# Altium footprint library Connectors Molex.PcbLib: 105 footprints (part 5 of 7)
Each footprint in its own frame and in the unit in brackets; x right, y up, seen from the top. Pads: shape width x height; smd on the part's side, far side on the other; paste and mask are expansions set on the pad; w line width, h text height; cw(c..) or ccw(c..) is an arc to the next point about the centre after c.
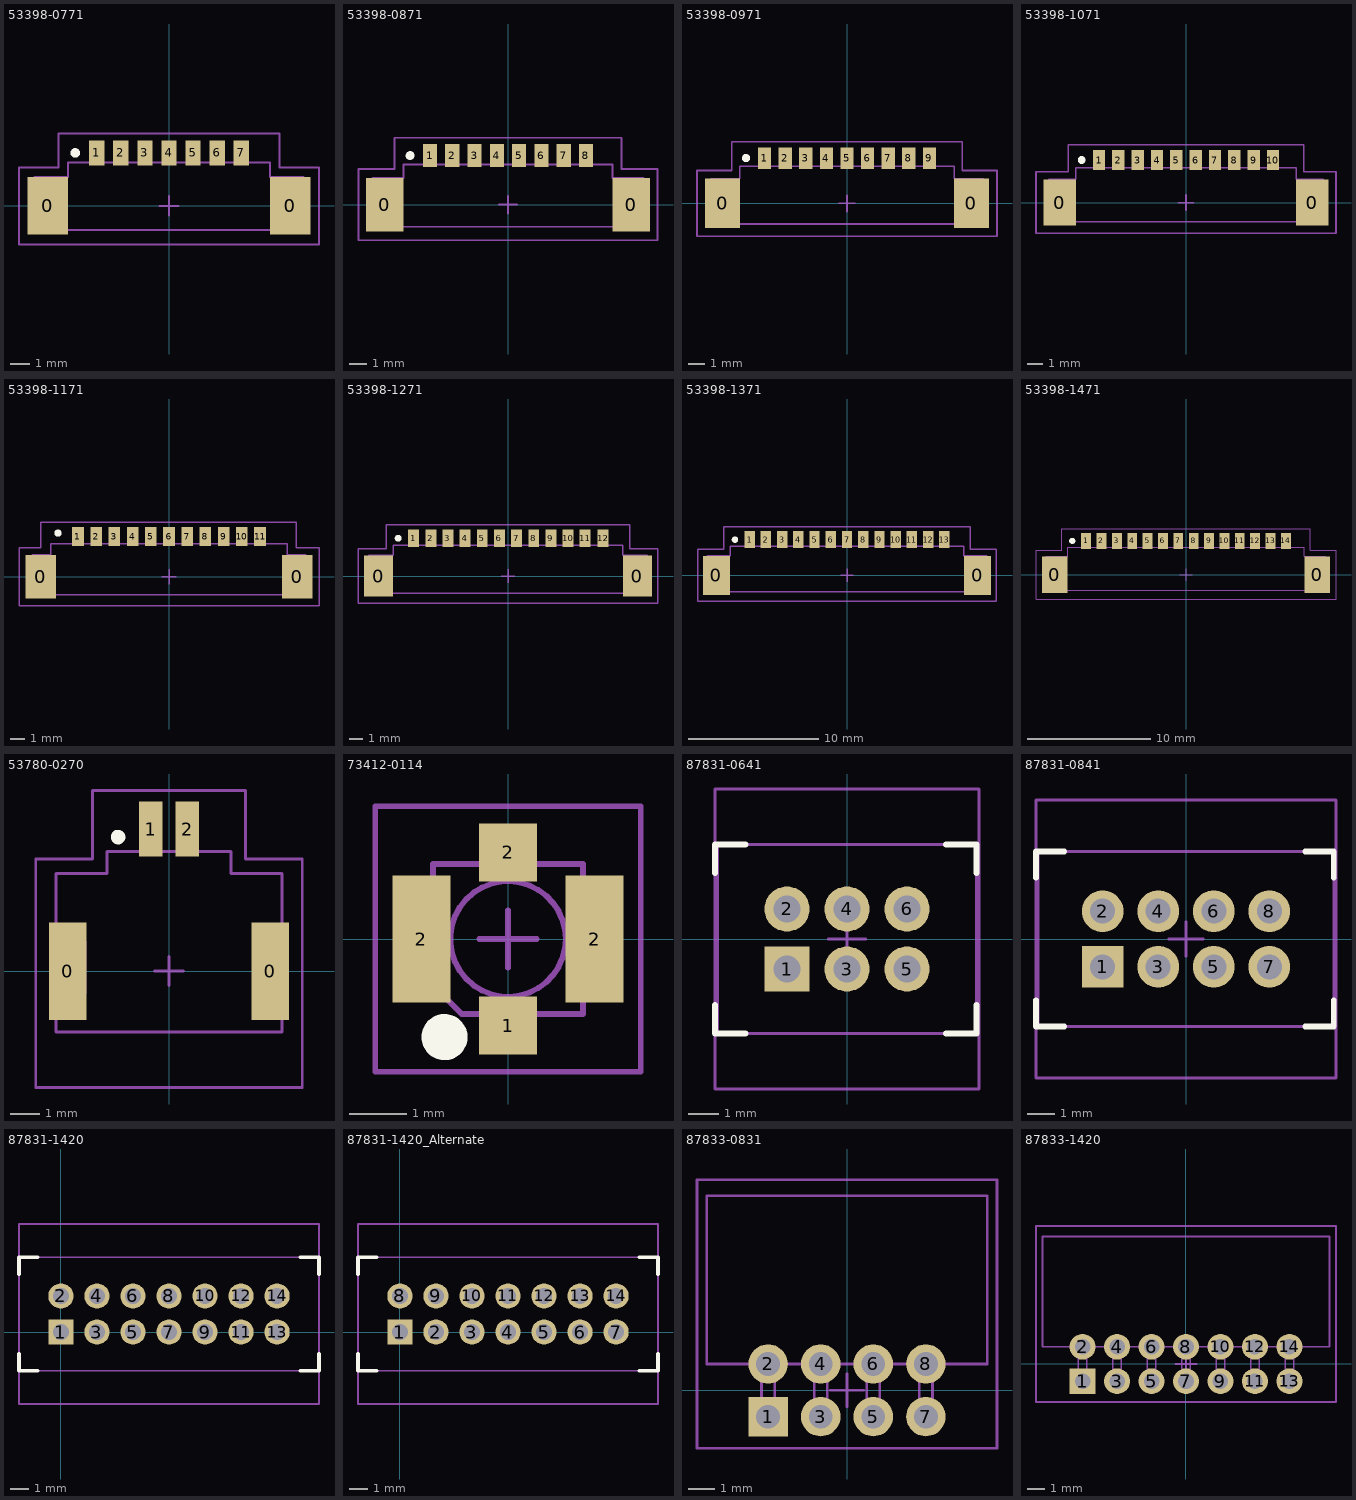
[diagram p4: the footprints below, top view; thin cyan lines are the x and y axes]

## 53398-0771 [mm] "PicoBlade™ 53398-0771"
height 4.7
pads (9):
  rect 2.1x3 smd: 0(-6.3,0) 0(6.3,0)
  rect 0.8x1.3 smd: 1(-3.75,2.75) 2(-2.5,2.75) 3(-1.25,2.75) 4(0,2.75) 5(1.25,2.75) 6(2.5,2.75) 7(3.75,2.75)
Top Overlay:
  circle w0.25: c-4.875,2.75 r0.125
Mechanical 1:
  lines w0.1: -7,-1.25 -7,1.5 -5.25,1.5 -5.25,2.25 5.25,2.25 5.25,1.5 7,1.5 7,-1.25 -7,-1.25
Mechanical 13:
  lines w0.1: -6.5,0.5 -6,1 -6,-0.75 ; -4,2.25 -4,3.25 -3.5,3.25 -3.5,2.25 ; -2.75,2.25 -2.75,3.25 -2.25,3.25 -2.25,2.25 ; -1.5,2.25 -1.5,3.25 -1,3.25 -1,2.25 ; -0.25,2.25 -0.25,3.25 0.25,3.25 0.25,2.25 ; 1,2.25 1,3.25 1.5,3.25 1.5,2.25 ; 2.25,2.25 2.25,3.25 2.75,3.25 2.75,2.25 ; 3.5,2.25 3.5,3.25 4,3.25 4,2.25 ; -7,-1.25 -7,1.5 -5.25,1.5 -5.25,2.25 5.25,2.25 5.25,1.5 7,1.5 7,-1.25 -7,-1.25
  text ".Designator" at -1.95,-0.375 h1.5
Mechanical 15:
  lines w0.1: -0.5,0 0.5,0 ; 0,-0.5 0,0.5 ; -7.8,-2 -7.8,2 -5.75,2 -5.75,3.75 -3,3.75 5.75,3.75 5.75,2 7.8,2 7.8,-2 -7.8,-2
3D body "533980771.stp": height 4.7, standoff 0, extent -6.95,-1.35 6.95,2.85

## 53398-0871 [mm] "PicoBlade™ 53398-0871"
height 4.7
pads (10):
  rect 2.1x3 smd: 0(-6.925,0) 0(6.925,0)
  rect 0.8x1.3 smd: 1(-4.375,2.75) 2(-3.125,2.75) 3(-1.875,2.75) 4(-0.625,2.75) 5(0.625,2.75) 6(1.875,2.75) 7(3.125,2.75) 8(4.375,2.75)
Top Overlay:
  circle w0.25: c-5.5,2.75 r0.125
Mechanical 1:
  lines w0.1: -7.625,-1.25 7.625,-1.25 7.625,1.5 5.875,1.5 5.875,2.25 -5.875,2.25 -5.875,1.5 -7.625,1.5 -7.625,-1.25
Mechanical 13:
  lines w0.1: -7.125,0.5 -6.625,1 -6.625,-0.75 ; -4.625,2.25 -4.625,3.25 -4.125,3.25 -4.125,2.25 ; -3.375,2.25 -3.375,3.25 -2.875,3.25 -2.875,2.25 ; -2.125,2.25 -2.125,3.25 -1.625,3.25 -1.625,2.25 ; -0.875,2.25 -0.875,3.25 -0.375,3.25 -0.375,2.25 ; 0.375,2.25 0.375,3.25 0.875,3.25 0.875,2.25 ; 1.625,2.25 1.625,3.25 2.125,3.25 2.125,2.25 ; 2.875,2.25 2.875,3.25 3.375,3.25 3.375,2.25 ; 4.125,2.25 4.125,3.25 4.625,3.25 4.625,2.25 ; -7.625,-1.25 7.625,-1.25 7.625,1.5 5.875,1.5 5.875,2.25 -5.875,2.25 -5.875,1.5 -7.625,1.5 -7.625,-1.25
  text ".Designator" at -1.925,-0.275 h1.5
Mechanical 15:
  lines w0.1: -0.5,0 0.5,0 ; 0,-0.5 0,0.5 ; -8.4,-2 8.4,-2 8.4,2 6.375,2 6.375,3.75 -3.625,3.75 -6.375,3.75 -6.375,2 -8.4,2 -8.4,-2
3D body "533980871.stp": height 4.7, standoff 0, extent -7.575,-1.35 7.575,2.85

## 53398-0971 [mm] "PicoBlade™ 53398-0971"
height 4.7
pads (11):
  rect 2.1x3 smd: 0(-7.55,0) 0(7.55,0)
  rect 0.8x1.3 smd: 1(-5,2.75) 2(-3.75,2.75) 3(-2.5,2.75) 4(-1.25,2.75) 5(0,2.75) 6(1.25,2.75) 7(2.5,2.75) 8(3.75,2.75) 9(5,2.75)
Top Overlay:
  circle w0.25: c-6.125,2.75 r0.125
Mechanical 1:
  lines w0.1: -8.25,-1.25 8.25,-1.25 8.25,1.5 6.5,1.5 6.5,2.25 -6.5,2.25 -6.5,1.5 -8.25,1.5 -8.25,-1.25
Mechanical 13:
  lines w0.1: -7.75,0.5 -7.25,1 -7.25,-0.75 ; -5.25,2.25 -5.25,3.25 -4.75,3.25 -4.75,2.25 ; -4,2.25 -4,3.25 -3.5,3.25 -3.5,2.25 ; -2.75,2.25 -2.75,3.25 -2.25,3.25 -2.25,2.25 ; -1.5,2.25 -1.5,3.25 -1,3.25 -1,2.25 ; -0.25,2.25 -0.25,3.25 0.25,3.25 0.25,2.25 ; 1,2.25 1,3.25 1.5,3.25 1.5,2.25 ; 2.25,2.25 2.25,3.25 2.75,3.25 2.75,2.25 ; 3.5,2.25 3.5,3.25 4,3.25 4,2.25 ; 4.75,2.25 4.75,3.25 5.25,3.25 5.25,2.25 ; -8.25,-1.25 8.25,-1.25 8.25,1.5 6.5,1.5 6.5,2.25 -6.5,2.25 -6.5,1.5 -8.25,1.5 -8.25,-1.25
  text ".Designator" at -2,-0.325 h1.5
Mechanical 15:
  lines w0.1: -0.5,0 0.5,0 ; 0,-0.5 0,0.5 ; -9.1,-2 9.1,-2 9.1,2 7,2 7,3.75 -3,3.75 -7,3.75 -7,2 -9.1,2 -9.1,-2
3D body "533980971.stp": height 4.7, standoff 0, extent -8.2,-1.35 8.2,2.85

## 53398-1071 [mm] "PicoBlade™ 53398-1071"
height 4.7
pads (12):
  rect 2.1x3 smd: 0(-8.175,0) 0(8.175,0)
  rect 0.8x1.3 smd: 1(-5.625,2.75) 2(-4.375,2.75) 3(-3.125,2.75) 4(-1.875,2.75) 5(-0.625,2.75) 6(0.625,2.75) 7(1.875,2.75) 8(3.125,2.75) 9(4.375,2.75) 10(5.625,2.75)
Top Overlay:
  circle w0.25: c-6.75,2.75 r0.125
Mechanical 1:
  lines w0.1: -8.875,-1.25 -8.875,1.5 -7.125,1.5 -7.125,2.25 7.125,2.25 7.125,1.5 8.875,1.5 8.875,-1.25 -8.875,-1.25
Mechanical 13:
  lines w0.1: -8.375,0.5 -7.875,1 -7.875,-0.75 ; -5.875,2.25 -5.875,3.25 -5.375,3.25 -5.375,2.25 ; -4.625,2.25 -4.625,3.25 -4.125,3.25 -4.125,2.25 ; -3.375,2.25 -3.375,3.25 -2.875,3.25 -2.875,2.25 ; -2.125,2.25 -2.125,3.25 -1.625,3.25 -1.625,2.25 ; -0.875,2.25 -0.875,3.25 -0.375,3.25 -0.375,2.25 ; 0.375,2.25 0.375,3.25 0.875,3.25 0.875,2.25 ; 1.625,2.25 1.625,3.25 2.125,3.25 2.125,2.25 ; 2.875,2.25 2.875,3.25 3.375,3.25 3.375,2.25 ; 4.125,2.25 4.125,3.25 4.625,3.25 4.625,2.25 ; 5.375,2.25 5.375,3.25 5.875,3.25 5.875,2.25 ; -8.875,-1.25 -8.875,1.5 -7.125,1.5 -7.125,2.25 7.125,2.25 7.125,1.5 8.875,1.5 8.875,-1.25 -8.875,-1.25
  text ".Designator" at -1.925,-0.35 h1.5
Mechanical 15:
  lines w0.1: -0.5,0 0.5,0 ; 0,-0.5 0,0.5 ; -9.7,-2 -9.7,2 -7.625,2 -7.625,3.75 -3.625,3.75 7.625,3.75 7.625,2 9.7,2 9.7,-2 -9.7,-2
3D body "533981071.stp": height 4.7, standoff 0, extent -8.825,-1.35 8.825,2.85

## 53398-1171 [mm] "PicoBlade™ 53398-1171"
height 4.7
pads (13):
  rect 2.1x3 smd: 0(-8.8,0) 0(8.8,0)
  rect 0.8x1.3 smd: 1(-6.25,2.75) 2(-5,2.75) 3(-3.75,2.75) 4(-2.5,2.75) 5(-1.25,2.75) 6(0,2.75) 7(1.25,2.75) 8(2.5,2.75) 9(3.75,2.75) 10(5,2.75) 11(6.25,2.75)
Top Overlay:
  circle w0.25: c-7.625,3 r0.125
Mechanical 1:
  lines w0.1: -9.375,-1.25 -9.375,1.5 -8.125,1.5 -8.125,2.25 8.125,2.25 8.125,1.5 9.375,1.5 9.375,-1.25 -9.375,-1.25
Mechanical 13:
  lines w0.1: -9,0.5 -8.5,1 -8.5,-0.75 ; -6.5,2.25 -6.5,3.25 -6,3.25 -6,2.25 ; -5.25,2.25 -5.25,3.25 -4.75,3.25 -4.75,2.25 ; -4,2.25 -4,3.25 -3.5,3.25 -3.5,2.25 ; -2.75,2.25 -2.75,3.25 -2.25,3.25 -2.25,2.25 ; -1.5,2.25 -1.5,3.25 -1,3.25 -1,2.25 ; -0.25,2.25 -0.25,3.25 0.25,3.25 0.25,2.25 ; 1,2.25 1,3.25 1.5,3.25 1.5,2.25 ; 2.25,2.25 2.25,3.25 2.75,3.25 2.75,2.25 ; 3.5,2.25 3.5,3.25 4,3.25 4,2.25 ; 4.75,2.25 4.75,3.25 5.25,3.25 5.25,2.25 ; 6,2.25 6,3.25 6.5,3.25 6.5,2.25 ; -9.375,-1.25 -9.375,1.5 -8.125,1.5 -8.125,2.25 8.125,2.25 8.125,1.5 9.375,1.5 9.375,-1.25 -9.375,-1.25
  text ".Designator" at -2.4,-0.3 h1.5
Mechanical 15:
  lines w0.1: -0.5,0 0.5,0 ; 0,-0.5 0,0.5 ; -10.3,-2 10.3,-2 10.3,2 8.75,2 8.75,3.75 -3,3.75 -8.8,3.75 -8.8,2 -10.3,2 -10.3,-2
3D body: height 4.7, standoff 0, extent -0.501,-0.501 0.501,0.501
3D body "533981171.stp": height 4.7, standoff 0, extent -9.45,-1.35 9.45,2.85

## 53398-1271 [mm] "PicoBlade™ 53398-1271"
height 4.7
pads (14):
  rect 2.1x3 smd: 0(-9.425,0) 0(9.425,0)
  rect 0.8x1.3 smd: 1(-6.875,2.75) 2(-5.625,2.75) 3(-4.375,2.75) 4(-3.125,2.75) 5(-1.875,2.75) 6(-0.625,2.75) 7(0.625,2.75) 8(1.875,2.75) 9(3.125,2.75) 10(4.375,2.75) 11(5.625,2.75) 12(6.925,2.75)
Top Overlay:
  circle w0.25: c-8,2.75 r0.125
Mechanical 1:
  lines w0.1: -10.125,-1.25 -10.125,1.5 -8.375,1.5 -8.375,2.25 8.375,2.25 8.375,1.5 10.125,1.5 10.125,-1.25 -10.125,-1.25
Mechanical 13:
  lines w0.1: -9.625,0.5 -9.125,1 -9.125,-0.75 ; -7.125,2.25 -7.125,3.25 -6.625,3.25 -6.625,2.25 ; -5.875,2.25 -5.875,3.25 -5.375,3.25 -5.375,2.25 ; -4.625,2.25 -4.625,3.25 -4.125,3.25 -4.125,2.25 ; -3.375,2.25 -3.375,3.25 -2.875,3.25 -2.875,2.25 ; -2.125,2.25 -2.125,3.25 -1.625,3.25 -1.625,2.25 ; -0.875,2.25 -0.875,3.25 -0.375,3.25 -0.375,2.25 ; 0.375,2.25 0.375,3.25 0.875,3.25 0.875,2.25 ; 1.625,2.25 1.625,3.25 2.125,3.25 2.125,2.25 ; 2.875,2.25 2.875,3.25 3.375,3.25 3.375,2.25 ; 4.125,2.25 4.125,3.25 4.625,3.25 4.625,2.25 ; 5.375,2.25 5.375,3.25 5.875,3.25 5.875,2.25 ; 6.625,2.25 6.625,3.25 7.125,3.25 7.125,2.25 ; -10.125,-1.25 -10.125,1.5 -8.375,1.5 -8.375,2.25 8.375,2.25 8.375,1.5 10.125,1.5 10.125,-1.25 -10.125,-1.25
  text ".Designator" at -2,-0.35 h1.5
Mechanical 15:
  lines w0.1: -0.5,0 0.5,0 ; 0,-0.5 0,0.5 ; -10.9,-2 -10.9,2 -8.875,2 -8.875,3.75 -4.875,3.75 8.875,3.75 8.875,2 10.9,2 10.9,-2 -10.9,-2
3D body "533981271.stp": height 4.7, standoff 0, extent -10.075,-1.35 10.075,2.85

## 53398-1371 [mm] "PicoBlade™ 53398-1371"
height 4.7
pads (15):
  rect 2.1x3 smd: 0(-10.05,0) 0(10.05,0)
  rect 0.8x1.3 smd: 1(-7.5,2.75) 2(-6.25,2.75) 3(-5,2.75) 4(-3.75,2.75) 5(-2.5,2.75) 6(-1.25,2.75) 7(0,2.75) 8(1.25,2.75) 9(2.5,2.75) 10(3.75,2.75) 11(5,2.75) 12(6.25,2.75) 13(7.5,2.75)
Top Overlay:
  circle w0.25: c-8.625,2.75 r0.125
Mechanical 1:
  lines w0.1: -10.75,-1.25 -10.75,1.5 -9,1.5 -9,2.25 9,2.25 9,1.5 10.75,1.5 10.75,-1.25 -10.75,-1.25
Mechanical 13:
  lines w0.1: -10.25,0.5 -9.75,1 -9.75,-0.75 ; -7.75,2.25 -7.75,3.25 -7.25,3.25 -7.25,2.25 ; -6.5,2.25 -6.5,3.25 -6,3.25 -6,2.25 ; -5.25,2.25 -5.25,3.25 -4.75,3.25 -4.75,2.25 ; -4,2.25 -4,3.25 -3.5,3.25 -3.5,2.25 ; -2.75,2.25 -2.75,3.25 -2.25,3.25 -2.25,2.25 ; -1.5,2.25 -1.5,3.25 -1,3.25 -1,2.25 ; -0.25,2.25 -0.25,3.25 0.25,3.25 0.25,2.25 ; 1,2.25 1,3.25 1.5,3.25 1.5,2.25 ; 2.25,2.25 2.25,3.25 2.75,3.25 2.75,2.25 ; 3.5,2.25 3.5,3.25 4,3.25 4,2.25 ; 4.75,2.25 4.75,3.25 5.25,3.25 5.25,2.25 ; 6,2.25 6,3.25 6.5,3.25 6.5,2.25 ; 7.25,2.25 7.25,3.25 7.75,3.25 7.75,2.25 ; -10.75,-1.25 -10.75,1.5 -9,1.5 -9,2.25 9,2.25 9,1.5 10.75,1.5 10.75,-1.25 -10.75,-1.25
  text ".Designator" at -2.025,-0.325 h1.5
Mechanical 15:
  lines w0.1: -0.5,0 0.5,0 ; 0,-0.5 0,0.5 ; -11.5,-2 -11.5,2 -9.5,2 -9.5,3.75 -5.5,3.75 9.5,3.75 9.5,2 11.5,2 11.5,-2 -11.5,-2
3D body "533981371.stp": height 4.7, standoff 0, extent -10.7,-1.1 10.7,3.1

## 53398-1471 [mm] "PicoBlade™ 53398-1471"
height 4.7
pads (16):
  rect 2.1x3 smd: 0(-10.675,0) 0(10.675,0)
  rect 0.8x1.3 smd: 1(-8.125,2.75) 2(-6.875,2.75) 3(-5.625,2.75) 4(-4.375,2.75) 5(-3.125,2.75) 6(-1.875,2.75) 7(-0.625,2.75) 8(0.625,2.75) 9(1.875,2.75) 10(3.125,2.75) 11(4.375,2.75) 12(5.625,2.75) 13(6.875,2.75) 14(8.125,2.75)
Top Overlay:
  circle w0.25: c-9.25,2.75 r0.125
Mechanical 1:
  lines w0.1: -11.375,-1.25 11.375,-1.25 11.375,1.5 9.625,1.5 9.625,2.25 -9.625,2.25 -9.625,1.5 -11.375,1.5 -11.375,-1.25
Mechanical 13:
  lines w0.1: -10.875,0.5 -10.375,1 -10.375,-0.75 ; -8.375,2.25 -8.375,3.25 -7.875,3.25 -7.875,2.25 ; -7.125,2.25 -7.125,3.25 -6.625,3.25 -6.625,2.25 ; -5.875,2.25 -5.875,3.25 -5.375,3.25 -5.375,2.25 ; -4.625,2.25 -4.625,3.25 -4.125,3.25 -4.125,2.25 ; -3.375,2.25 -3.375,3.25 -2.875,3.25 -2.875,2.25 ; -2.125,2.25 -2.125,3.25 -1.625,3.25 -1.625,2.25 ; -0.875,2.25 -0.875,3.25 -0.375,3.25 -0.375,2.25 ; 0.375,2.25 0.375,3.25 0.875,3.25 0.875,2.25 ; 1.625,2.25 1.625,3.25 2.125,3.25 2.125,2.25 ; 2.875,2.25 2.875,3.25 3.375,3.25 3.375,2.25 ; 4.125,2.25 4.125,3.25 4.625,3.25 4.625,2.25 ; 5.375,2.25 5.375,3.25 5.875,3.25 5.875,2.25 ; 6.625,2.25 6.625,3.25 7.125,3.25 7.125,2.25 ; 7.875,2.25 7.875,3.25 8.375,3.25 8.375,2.25 ; -11.375,-1.25 11.375,-1.25 11.375,1.5 9.625,1.5 9.625,2.25 -9.625,2.25 -9.625,1.5 -11.375,1.5 -11.375,-1.25
  text ".Designator" at -2,-0.425 h1.5
Mechanical 15:
  lines w0.1: -0.5,0 0.5,0 ; 0,-0.5 0,0.5 ; -12.2,-2 12.2,-2 12.2,2 10.125,2 10.125,3.75 -6.125,3.75 -10.125,3.75 -10.125,2 -12.2,2 -12.2,-2
3D body "533981471.stp": height 4.7, standoff 0, extent -11.325,-1.35 11.325,2.85

## 53780-0270 [mm] "PanelMate™ 53780"
height 1.85
pads (4):
  rect 1.3x3.35 smd: 0(-3.475,0) 0(3.475,0)
  rect 0.8x1.9 smd: 1(-0.625,4.875) 2(0.625,4.875)
Top Overlay:
  circle w0.25: c-1.75,4.6 r0.125
Mechanical 13:
  lines w0.1: -3.375,0.5 -2.875,1 -2.875,-0.75 ; -0.875,4.1 -0.875,5.1 -0.375,5.1 -0.375,4.1 ; 0.375,4.1 0.375,5.1 0.875,5.1 0.875,4.1 ; -3.875,-2.1 -3.875,3.35 -2.125,3.35 -2.125,4.1 2.125,4.1 2.125,3.35 3.875,3.35 3.875,-2.1 -3.875,-2.1
  text ".Designator" at -1.2,1.3 h1.5
Mechanical 15:
  lines w0.1: -0.5,0 0.5,0 ; 0,-0.5 0,0.5 ; -4.575,-4 -4.575,3.85 -2.625,3.85 -2.625,6.2 2.625,6.2 2.625,3.85 4.575,3.85 4.575,-4 -4.575,-4
3D body "537800270.stp": height 1.9, standoff 0, extent -3.825,-1.45 3.825,5.05

## 73412-0114 [mm] "Ultra Miniature Coaxial"
height 1.3
pads (4):
  rect 1x1 smd: 1(0,-1.5) 2(0,1.5)
  rect 1x2.2 smd: 2(-1.5,0) 2(1.5,0)
Top Overlay:
  circle w0.4: c-1.1,-1.7 r0.2
Mechanical 13:
  circle w0.1: c0,0 r1
  lines w0.1: -1.3,-0.8 -0.8,-1.3 1.3,-1.3 1.3,1.3 -1.3,1.3 -1.3,-0.8
  text ".Designator" at -0.8,-0.4 h1.5
Mechanical 15:
  lines w0.1: -0.5,0 0.5,0 ; 0,-0.5 0,0.5 ; -2.3,-2.3 -2.3,2.3 2.3,2.3 2.3,-2.3 -2.3,-2.3
3D body "734120114.stp": height 1.3, standoff 0, extent -1.5,-1.54 1.5,1.54

## 87831-0641 [mm] "Milli-Grid™ 87831-0641"
height 6.4
pads (6):
  rect 1.5x1.5 hole 0.9: 1(-2,-1)
  round 1.5 hole 0.9: 2(-2,1) 3(0,-1) 4(0,1) 5(2,-1) 6(2,1)
Top Overlay:
  lines w0.2: -4.4,-2.2 -4.4,-3.15 -3.375,-3.15 ; -4.4,2.2 -4.4,3.15 -3.375,3.15 ; 3.3,-3.15 4.325,-3.15 4.325,-2.2 ; 3.3,3.15 4.325,3.15 4.325,2.2
Mechanical 13:
  lines w0.1: -4.325,-3.15 -4.325,3.15 4.325,3.15 4.325,-3.15 -4.325,-3.15
  text "1" at -3.6,-2.5 h1.5
  text ".Designator" at -1.1,-0.3 h1.5
Mechanical 15:
  lines w0.1: -0.625,0 0.625,0 ; 0,-0.625 0,0.625 ; -4.4,-5 -4.4,5 4.4,5 4.4,-5 -4.4,-5
3D body "878310641.stp": height 6.35, standoff -2.55, extent -4.325,-3.15 4.325,3.15

## 87831-0841 [mm] "Milli-Grid™ 87831-0841"
height 6.4
pads (8):
  rect 1.5x1.5 hole 0.9: 1(-3,-1)
  round 1.5 hole 0.9: 2(-3,1) 3(-1,-1) 4(-1,1) 5(1,-1) 6(1,1) 7(3,-1) 8(3,1)
Top Overlay:
  lines w0.2: -5.4,-2.2 -5.4,-3.15 -4.375,-3.15 ; -5.4,2.2 -5.4,3.15 -4.375,3.15 ; 4.3,-3.15 5.325,-3.15 5.325,-2.2 ; 4.3,3.15 5.325,3.15 5.325,2.2
Mechanical 13:
  lines w0.1: -5.325,-3.15 -5.325,3.15 5.325,3.15 5.325,-3.15 -5.325,-3.15
  text "1" at -4.6,-2.5 h1.5
  text ".Designator" at -1.1,-0.3 h1.5
Mechanical 15:
  lines w0.1: -0.625,0 0.625,0 ; 0,-0.625 0,0.625 ; -5.4,-5 -5.4,5 5.4,5 5.4,-5 -5.4,-5
3D body "878310841.stp": height 6.35, standoff -2.55, extent -5.325,-3.15 5.325,3.15

## 87831-1420 [mm] "Milli-Grid™ 87831-1420"
height 6.4
pads (14):
  rect 1.4x1.4 hole 0.9: 1(0,0)
  round 1.4 hole 0.9: 2(0,2) 3(2,0) 4(2,2) 5(4,0) 6(4,2) 7(6,0) 8(6,2) 9(8,0) 10(8,2) 11(10,0) 12(10,2) 13(12,0) 14(12,2)
Top Overlay:
  lines w0.2: -2.325,-1.2 -2.325,-2.15 -1.3,-2.15 ; -2.325,3.2 -2.325,4.15 -1.3,4.15 ; 13.3,-2.15 14.325,-2.15 14.325,-1.2 ; 13.3,4.15 14.325,4.15 14.325,3.2
Mechanical 13:
  lines w0.1: -2.325,-2.15 14.325,-2.15 14.325,4.15 -2.325,4.15 -2.325,-2.15
  text ".Designator" at 2.4,0.6 h1.5
  text "1" at -1.5,-1.4 h1.5
Mechanical 15:
  lines w0.1: -2.325,-4 -2.325,6 14.325,6 14.325,-4 -2.325,-4
3D body "878311420.stp": height 6.4, standoff -2.5, extent -2.325,-2.15 14.325,4.15

## 87831-1420_Alternate [mm] "Milli-Grid™ 87831-1420 Другая нумерация падов"
height 6.4
pads (14):
  rect 1.4x1.4 hole 0.9: 1(0,0)
  round 1.4 hole 0.9: 2(2,0) 3(4,0) 4(6,0) 5(8,0) 6(10,0) 7(12,0) 8(0,2) 9(2,2) 10(4,2) 11(6,2) 12(8,2) 13(10,2) 14(12,2)
Top Overlay:
  lines w0.2: -2.325,-1.2 -2.325,-2.15 -1.3,-2.15 ; -2.325,3.2 -2.325,4.15 -1.3,4.15 ; 13.3,-2.15 14.325,-2.15 14.325,-1.2 ; 13.3,4.15 14.325,4.15 14.325,3.2
Mechanical 13:
  lines w0.1: -2.325,-2.15 14.325,-2.15 14.325,4.15 -2.325,4.15 -2.325,-2.15
  text ".Designator" at 2.4,0.6 h1.5
  text "1" at -1.5,-1.4 h1.5
Mechanical 15:
  lines w0.1: -2.325,-4 -2.325,6 14.325,6 14.325,-4 -2.325,-4
3D body "878311420.stp": height 6.4, standoff -2.5, extent -2.325,-2.15 14.325,4.15

## 87833-0831 [mm] "Milli-Grid™ 87833-0831"
height 6.3
pads (8):
  rect 1.5x1.5 hole 0.9: 1(-3,-1)
  round 1.5 hole 0.9: 2(-3,1) 3(-1,-1) 4(-1,1) 5(1,-1) 6(1,1) 7(3,-1) 8(3,1)
Mechanical 13:
  lines w0.1: -3.25,1 -3.25,-1.25 -2.75,-1.25 -2.75,1 ; -1.25,1 -1.25,-1.25 -0.75,-1.25 -0.75,1 ; 0.75,1 0.75,-1.25 1.25,-1.25 1.25,1 ; 2.75,1 2.75,-1.25 3.25,-1.25 3.25,1 ; -5.325,1 -5.325,7.4 5.325,7.4 5.325,1 -5.325,1
  text ".Designator" at -1.4,3 h1.5
Mechanical 15:
  lines w0.1: -0.625,0 0.625,0 ; 0,-0.625 0,0.625 ; -5.7,-2.2 5.7,-2.2 5.7,8 -5.7,8 -5.7,-2.2
3D body "878330831.stp": height 6.3, standoff -2.16, extent -5.325,-1.25 5.325,7.4

## 87833-1420 [mm] "Milli-Grid™ 87833"
height 6.3
pads (14):
  rect 1.5x1.5 hole 0.9: 1(-6,-1)
  round 1.5 hole 0.9: 2(-6,1) 3(-4,-1) 4(-4,1) 5(-2,-1) 6(-2,1) 7(0,-1) 8(0,1) 9(2,-1) 10(2,1) 11(4,-1) 12(4,1) 13(6,-1) 14(6,1)
Mechanical 13:
  lines w0.1: -6.25,1 -6.25,-1.25 -5.75,-1.25 -5.75,1 ; -4.25,1 -4.25,-1.25 -3.75,-1.25 -3.75,1 ; -2.25,1 -2.25,-1.25 -1.75,-1.25 -1.75,1 ; -0.25,1 -0.25,-1.25 0.25,-1.25 0.25,1 ; 1.75,1 1.75,-1.25 2.25,-1.25 2.25,1 ; 3.75,1 3.75,-1.25 4.25,-1.25 4.25,1 ; 5.75,1 5.75,-1.25 6.25,-1.25 6.25,1 ; -8.325,1 -8.325,7.4 8.325,7.4 8.325,1 -8.325,1
  text ".Designator" at -1.4,3 h1.5
Mechanical 15:
  lines w0.1: -0.625,0 0.625,0 ; 0,-0.625 0,0.625 ; -8.7,-2.2 8.7,-2.2 8.7,8 -8.7,8 -8.7,-2.2
3D body "878331420.stp": height 6.3, standoff -2.16, extent -8.325,-1.25 8.325,7.4